# Altium footprint library RPSLib.PcbLib: 199 footprints (part 5 of 13)
Each footprint in its own frame and in the unit in brackets; x right, y up, seen from the top. Pads: shape width x height; smd on the part's side, far side on the other; paste and mask are expansions set on the pad; w line width, h text height; cw(c..) or ccw(c..) is an arc to the next point about the centre after c.
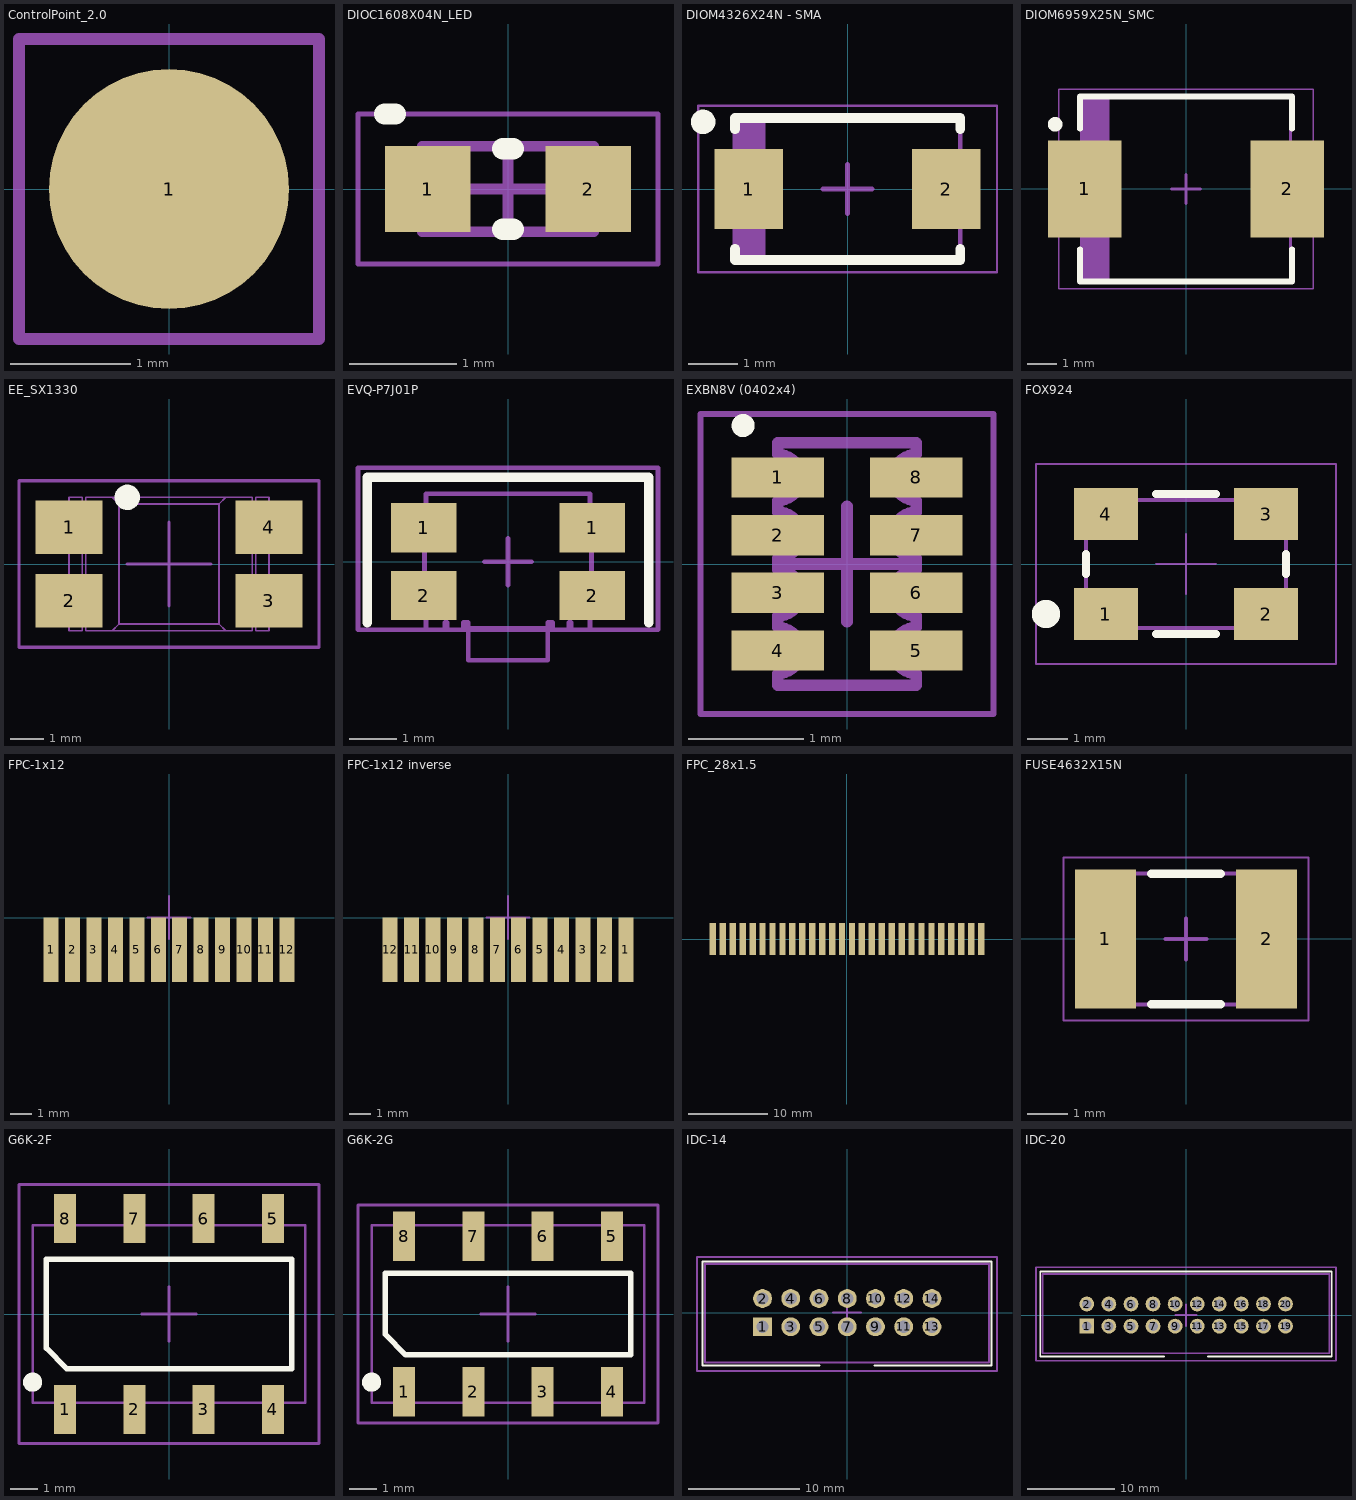
[diagram p4: the footprints below, top view; thin cyan lines are the x and y axes]

## ControlPoint_2.0 [mm] "Контрольная точка d 2.0"
pads (1):
  round 2 smd mask+0.2: 1(0,0)
Mechanical 15:
  lines w0.1: -1.25,-1.25 1.25,-1.25 1.25,1.25 -1.25,1.25 -1.25,-1.25

## DIOC1608X04N_LED [mm] "Chip LED, 2-Leads, Body 1,60x0,80mm, IPC Medium Density"
height 0.35
pads (2):
  rect 0.8x0.8 smd: 1(-0.75,0) 2(0.75,0)
Top Overlay:
  lines w0.2: -1.15,0.7 -1.05,0.7 ; -0.05,-0.375 0.05,-0.375 ; -0.05,0.375 0.05,0.375
Mechanical 13:
  lines w0.1: -0.8,-0.4 -0.8,0.4 0.8,0.4 0.8,-0.4 -0.8,-0.4
Mechanical 15:
  lines w0.05: -1.4,-0.7 -1.4,0.7 1.4,0.7 1.4,-0.7 -1.4,-0.7
  lines w0.1: -0.4,0 0.4,0 ; 0,-0.4 0,0.4
3D body "LTST-C193KGKT-5A.stp": height 0.35, standoff 0, extent -0.81,-0.4 0.81,0.4

## DIOM4326X24N - SMA [mm] "Molded Diode, 2-Leads, Body 4,28x2,58mm, IPC Medium Density"
height 2.45
pads (2):
  rect 1.4x1.64 smd: 1(-2.015,0) 2(2.015,0)
Top Overlay:
  circle w0.25: c-2.95,1.37 r0.125
  lines w0.2: -2.3,-1.22 -2.3,-1.45 2.3,-1.45 2.3,-1.22 ; -2.3,1.22 -2.3,1.45 2.3,1.45 2.3,1.22
Mechanical 13:
  rectangle: -2.3,-1.45 -1.681,1.45
  lines w0.1: -2.3,-1.45 2.3,-1.45 2.3,1.45 -2.3,1.45 -2.3,-1.45
Mechanical 15:
  lines w0.05: -3.05,-1.7 3.05,-1.7 3.05,1.7 -3.05,1.7 -3.05,-1.7
  lines w0.1: -0.5,0 0.5,0 ; 0,-0.5 0,0.5
3D body "DIOM4326X24N - SMA.step": height 2.45, standoff 0, extent -2.52,-1.45 2.52,1.45

## DIOM6959X25N_SMC [mm] "Molded Diode, 2-Leads, Body 6,86x5,91mm, IPC Medium Density"
height 2.5
pads (2):
  rect 2.5x3.3 smd: 1(-3.45,0) 2(3.45,0)
Top Overlay:
  circle w0.25: c-4.45,2.2 r0.125
  lines w0.2: -3.6,-2.05 -3.6,-3.15 3.6,-3.15 3.6,-2.05 ; -3.6,2.05 -3.6,3.15 3.6,3.15 3.6,2.05
Mechanical 13:
  rectangle: -3.555,-3.11 -2.599,3.11
  lines w0.1: -3.555,-3.11 -3.555,3.11 3.555,3.11 3.555,-3.11 -3.555,-3.11
Mechanical 15:
  lines w0.05: -4.325,-3.4 -4.325,3.4 4.325,3.4 4.325,-3.4 -4.325,-3.4
  lines w0.1: -0.5,0 0.5,0 ; 0,-0.5 0,0.5
3D body "DIOM6959X25N_SMC.step": height 2.5, standoff 0, extent -3.775,-3.11 3.775,3.11

## EE_SX1330 [mm] "Photointerrupter"
height 5
pads (4):
  rect 2x1.6 smd mask+0.07: 1(-3,1.1) 2(-3,-1.1) 3(3,-1.1) 4(3,1.1)
Top Overlay:
  circle w0.4: c-1.25,2 r0.18
Mechanical 13:
  lines w0.05: -2.6,-1.75 -2.5,-1.75 ; -2.6,1.75 -2.5,1.75 ; 2.5,-1.75 2.6,-1.75 ; 2.5,1.75 2.6,1.75 ; -1.7,-2 1.7,-2 ; -1.7,-2 -2.5,-2 -2.5,2 -1.7,2 ; -1.7,-2 -1.5,-1.8 ; -1.7,2 1.7,2 ; -1.7,2 -1.5,1.8 ; -1.5,-1.8 1.5,-1.8 ; -1.5,-1.8 -1.5,1.8 ; -1.5,1.8 1.5,1.8 ; 1.5,-1.8 1.5,1.8 ; 1.5,-1.8 1.7,-2 ; 1.5,1.8 1.7,2 ; 1.7,-2 2.5,-2 2.5,2 1.7,2 ; -3,-2 -3,2 -2.6,2 -2.6,-2 -3,-2 ; 2.6,-2 2.6,2 3,2 3,-2 2.6,-2
Mechanical 15:
  lines w0.1: -1.25,0 1.25,0 ; 0,-1.25 0,1.25 ; -4.5,-2.5 4.5,-2.5 4.5,2.5 -4.5,2.5 -4.5,-2.5
3D body "EE_SX1330.step": height 5, standoff 0, extent -3,-2 3,2

## EVQ-P7J01P [mm] "Tactile switch"
height 1.35
pads (4):
  rect 1.4x1.05 smd: 1(-1.8,0.725) 1(1.8,0.725) 2(-1.8,-0.725) 2(1.8,-0.725)
Top Overlay:
  lines w0.2: -3,-1.3 -3,1.8 3,1.8 3,-1.3
Mechanical 13:
  lines w0.1: -1.78,-0.43 -2.1,-0.43 -2.1,-0.45 cw(c-2.2,-0.45) -2.2,-0.55 -2.35,-0.55 -2.35,-1.05 -1.75,-1.05 -1.75,-0.45 -1.78,-0.45 -1.78,0.45 -1.75,0.45 -1.75,1.05 -2.35,1.05 -2.35,0.55 -2.2,0.55 cw(c-2.2,0.45) -2.1,0.45 -2.1,0.43 -1.78,0.43 ; -1.75,-0.475 -1.75,-1.3 -1.75,-1.45 -1.35,-1.45 -1.35,-1.3 -1.3,-1.3 -1.3,-1.45 -0.95,-1.45 -0.95,-1.3 -0.85,-1.3 -0.85,-1.55 -0.85,-2.1 -0.25,-2.1 ; -1.75,0.475 -1.75,1.3 -1.75,1.45 -1.35,1.45 ; -1.7,1.45 -1.3,1.45 0,1.45 1.3,1.45 1.7,1.45 ; -0.85,-1.425 0.85,-1.425 ; -0.2,-2.1 -0.25,-2.1 ; 0.2,-2.1 0.25,-2.1 ; 1.35,1.45 1.75,1.45 1.75,1.3 1.75,0.475 ; 1.75,-0.475 1.75,-1.3 1.75,-1.45 1.35,-1.45 1.35,-1.3 1.3,-1.3 1.3,-1.45 0.95,-1.45 0.95,-1.3 0.85,-1.3 0.85,-1.55 0.85,-2.1 0.25,-2.1 ; 1.78,-0.43 2.1,-0.43 2.1,-0.45 ccw(c2.2,-0.45) 2.2,-0.55 2.35,-0.55 2.35,-1.05 1.75,-1.05 1.75,-0.45 1.78,-0.45 1.78,0.45 1.75,0.45 1.75,1.05 2.35,1.05 2.35,0.55 2.2,0.55 ccw(c2.2,0.45) 2.1,0.45 2.1,0.43 1.78,0.43 ; -0.25,-2.1 0,-2.1 0.25,-2.1
Mechanical 15:
  lines w0.1: -0.5,0 0.5,0 ; 0,-0.5 0,0.5 ; -3.2,-1.45 3.2,-1.45 3.2,2 -3.2,2 -3.2,-1.45
3D body "EVQ-P7J01P.stp": height 1.35, standoff 0, extent -2.35,-2.1 2.35,1.45

## EXBN8V (0402x4) [mm] "Chip Array, Concave, 8-Leads, Pitch 0,50mm,  Body 2,00x1,00mm,  IPC Medium Density"
height 0.4
pads (8):
  rect 0.8x0.35 smd mask+0.07: 1(-0.6,0.75) 2(-0.6,0.25) 3(-0.6,-0.25) 4(-0.6,-0.75) 5(0.6,-0.75) 6(0.6,-0.25) 7(0.6,0.25) 8(0.6,0.75)
Top Overlay:
  circle w0.1: c-0.9,1.2 r0.05
Mechanical 13:
  lines w0.1: -0.6,-1.05 0.6,-1.05 0.6,-0.95 cw(c0.6,-0.75) 0.6,-0.55 0.6,-0.45 cw(c0.6,-0.25) 0.6,-0.05 0.6,0.05 cw(c0.6,0.25) 0.6,0.45 0.6,0.55 cw(c0.6,0.75) 0.6,0.95 0.6,1.05 -0.6,1.05 -0.6,0.95 cw(c-0.6,0.75) -0.6,0.55 -0.6,0.45 cw(c-0.6,0.25) -0.6,0.05 -0.6,-0.05 cw(c-0.6,-0.25) -0.6,-0.45 -0.6,-0.55 cw(c-0.6,-0.75) -0.6,-0.95 -0.6,-1.05
Mechanical 15:
  lines w0.05: -1.27,-1.3 1.27,-1.3 1.27,1.3 -1.27,1.3 -1.27,-1.3
  lines w0.1: -0.5,0 0.5,0 ; 0,-0.5 0,0.5
3D body "EXBN8V (0402x4).step": height 0.4, standoff 0, extent -0.6,-1.05 0.6,1.05

## FOX924 [mm] "Ultra Miniature SMD TCXO, 5x7mm"
height 1.5
pads (4):
  rect 1.6x1.3 smd paste-0.05: 1(-2,-1.25) 2(2,-1.25) 3(2,1.25) 4(-2,1.25)
Top Overlay:
  circle w0.508: c-3.5,-1.25 r0.1
  lines w0.2: -2.5,-0.25 -2.5,0.25 ; -0.75,-1.75 0.75,-1.75 ; -0.75,1.75 0.75,1.75 ; 2.5,-0.25 2.5,0.25
Mechanical 13:
  lines w0.1: -2.5,-1.6 2.5,-1.6 2.5,1.6 -2.5,1.6 -2.5,-1.6
Mechanical 15:
  lines w0.05: -0.75,0 0.75,0 ; 0,-0.75 0,0.75 ; -3.75,-2.5 -3.75,2.5 3.75,2.5 3.75,-2.5 -3.75,-2.5
3D body "FOX-924.stp": height 1.5, standoff 0, extent -2.5,-1.6 2.5,1.6

## FPC-1x12 [mm] "FPC cable 1 mm pitch, 12 pos"
pads (12):
  rect 0.7x3 smd mask+0.07: 1(-5.5,-1.5) 2(-4.5,-1.5) 3(-3.5,-1.5) 4(-2.5,-1.5) 5(-1.5,-1.5) 6(-0.5,-1.5) 7(0.5,-1.5) 8(1.5,-1.5) 9(2.5,-1.5) 10(3.5,-1.5) 11(4.5,-1.5) 12(5.5,-1.5)
Mechanical 15:
  lines w0.1: -1,0 1,0 ; 0,-1 0,1

## FPC-1x12 inverse [mm] "FPC cable 1 mm pitch, 12 pos"
pads (12):
  rect 0.7x3 smd mask+0.07: 1(5.5,-1.5) 2(4.5,-1.5) 3(3.5,-1.5) 4(2.5,-1.5) 5(1.5,-1.5) 6(0.5,-1.5) 7(-0.5,-1.5) 8(-1.5,-1.5) 9(-2.5,-1.5) 10(-3.5,-1.5) 11(-4.5,-1.5) 12(-5.5,-1.5)
Mechanical 15:
  lines w0.1: -1,0 1,0 ; 0,-1 0,1

## FPC_28x1.5 [mm]
pads (28):
  rect 0.8x4 smd mask+0.07: 1(-16.875,0) 2(-15.625,0) 3(-14.375,0) 4(-13.125,0) 5(-11.875,0) 6(-10.625,0) 7(-9.375,0) 8(-8.125,0) 9(-6.875,0) 10(-5.625,0) 11(-4.375,0) 12(-3.125,0) 13(-1.875,0) 14(-0.625,0) 15(0.625,0) 16(1.875,0) 17(3.125,0) 18(4.375,0) 19(5.625,0) 20(6.875,0) 21(8.125,0) 22(9.375,0) 23(10.625,0) 24(11.875,0) 25(13.125,0) 26(14.375,0) 27(15.625,0) 28(16.875,0)

## FUSE4632X15N [mm] "Chip Fuse, 2-Leads, Body 4,55x3,24mm, IPC Medium Density"
height 1.5
pads (2):
  rect 1.5x3.4 smd: 1(-1.975,0) 2(1.975,0)
Top Overlay:
  lines w0.2: -0.85,-1.6 0.85,-1.6 ; -0.85,1.6 0.85,1.6
Mechanical 13:
  lines w0.1: -2.25,-1.6 -2.25,1.6 2.25,1.6 2.25,-1.6 -2.25,-1.6
Mechanical 15:
  lines w0.05: -3,-2 -3,2 3,2 3,-2 -3,-2
  lines w0.1: -0.5,0 0.5,0 ; 0,-0.5 0,0.5
3D body "0ZCG0150BF2C.stp": height 1.4, standoff 0, extent -2.25,-1.6 2.25,1.6

## G6K-2F [mm] "G6K Relay"
height 5.2
pads (8):
  rect 0.8x1.8 smd mask+0.07: 1(-3.81,-3.5) 2(-1.27,-3.5) 3(1.27,-3.5) 4(3.81,-3.5) 5(3.81,3.5) 6(1.27,3.5) 7(-1.27,3.5) 8(-3.81,3.5)
Top Overlay:
  circle w0.4: c-5,-2.5 r0.15
  lines w0.2: -4.5,-1.25 -4.5,2 4.5,2 4.5,-2 -3.75,-2 -4.5,-1.25
Mechanical 13:
  lines w0.1: -5,-3.25 5,-3.25 5,3.25 -5,3.25 -5,-3.25
Mechanical 15:
  lines w0.1: -1,0 1,0 ; 0,-1 0,1 ; -5.5,-4.75 5.5,-4.75 5.5,4.75 -5.5,4.75 -5.5,-4.75
3D body "g6k-2f_24dc.stp": height 5.2, standoff 0, extent -5,-3.9 5,3.9

## G6K-2G [mm] "G6K Relay"
height 5.2
pads (8):
  rect 0.8x1.8 smd mask+0.07: 1(-3.81,-2.85) 2(-1.27,-2.85) 3(1.27,-2.85) 4(3.81,-2.85) 5(3.81,2.85) 6(1.27,2.85) 7(-1.27,2.85) 8(-3.81,2.85)
Top Overlay:
  circle w0.4: c-5,-2.5 r0.15
  lines w0.2: -4.5,-0.75 -3.75,-1.5 4.5,-1.5 4.5,1.5 -4.5,1.5 -4.5,-0.75
Mechanical 13:
  lines w0.1: -5,-3.25 -5,3.25 5,3.25 5,-3.25 -5,-3.25
Mechanical 15:
  lines w0.1: -1,0 1,0 ; 0,-1 0,1 ; -5.5,-4 -5.5,4 5.5,4 5.5,-4 -5.5,-4
3D body "g6k-2g_5dc.stp": height 5.2, standoff 0, extent -5,-3.26 5,3.26

## IDC-14 [mm] "2.54 мм разъем"
height 9.1
pads (14):
  rect 1.7x1.7 hole 1.1: 1(-7.6,-1.27)
  round 1.7 hole 1.1: 2(-7.6,1.27) 3(-5.06,-1.27) 4(-5.06,1.27) 5(-2.52,-1.27) 6(-2.52,1.27) 7(0.02,-1.27) 8(0.02,1.27) 9(2.56,-1.27) 10(2.56,1.27) 11(5.1,-1.27) 12(5.1,1.27) 13(7.64,-1.27) 14(7.64,1.27)
Top Overlay:
  lines w0.2: -2.5,-4.75 -13,-4.75 -13,4.6 13,4.6 13,-4.75 2.5,-4.75
Mechanical 13:
  lines w0.2: -12.79,-4.5 -12.79,4.4 12.79,4.4 12.79,-4.5 -12.79,-4.5
Mechanical 15:
  lines w0.2: -1.25,0 1.25,0 ; 0,-1.25 0,1.25 ; -13.5,-5.25 13.5,-5.25 13.5,5 -13.5,5 -13.5,-5.25
3D body "IDC-20.stp": height 9, standoff -3.6, extent -12.79,-4.5 12.79,4.4

## IDC-20 [mm] "2.54 мм разъем"
height 9.1
pads (20):
  rect 1.7x1.7 hole 1.1: 1(-11.41,-1.27)
  round 1.7 hole 1.1: 2(-11.41,1.27) 3(-8.87,-1.27) 4(-8.87,1.27) 5(-6.33,-1.27) 6(-6.33,1.27) 7(-3.79,-1.27) 8(-3.79,1.27) 9(-1.25,-1.27) 10(-1.25,1.27) 11(1.29,-1.27) 12(1.29,1.27) 13(3.83,-1.27) 14(3.83,1.27) 15(6.37,-1.27) 16(6.37,1.27) 17(8.91,-1.27) 18(8.91,1.27) 19(11.45,-1.27) 20(11.45,1.27)
Top Overlay:
  lines w0.2: -2.5,-4.75 -16.75,-4.75 -16.75,5 16.75,5 16.75,-4.75 2.5,-4.75
Mechanical 13:
  lines w0.2: -16.51,-4.375 16.51,-4.375 16.51,4.725 -16.51,4.725 -16.51,-4.375
Mechanical 15:
  lines w0.2: -1.25,0 1.25,0 ; 0,-1.25 0,1.25 ; -17.25,-5.25 -17.25,5.5 17.25,5.5 17.25,-5.25 -17.25,-5.25
3D body "IDC-20.stp": height 9.1, standoff -2.75, extent -16.51,-4.375 16.51,4.725